# Altium footprint library NES-Footprints.PcbLib: 92 footprints (part 2 of 6)
Each footprint in its own frame and in the unit in brackets; x right, y up, seen from the top. Pads: shape width x height; smd on the part's side, far side on the other; paste and mask are expansions set on the pad; w line width, h text height; cw(c..) or ccw(c..) is an arc to the next point about the centre after c.
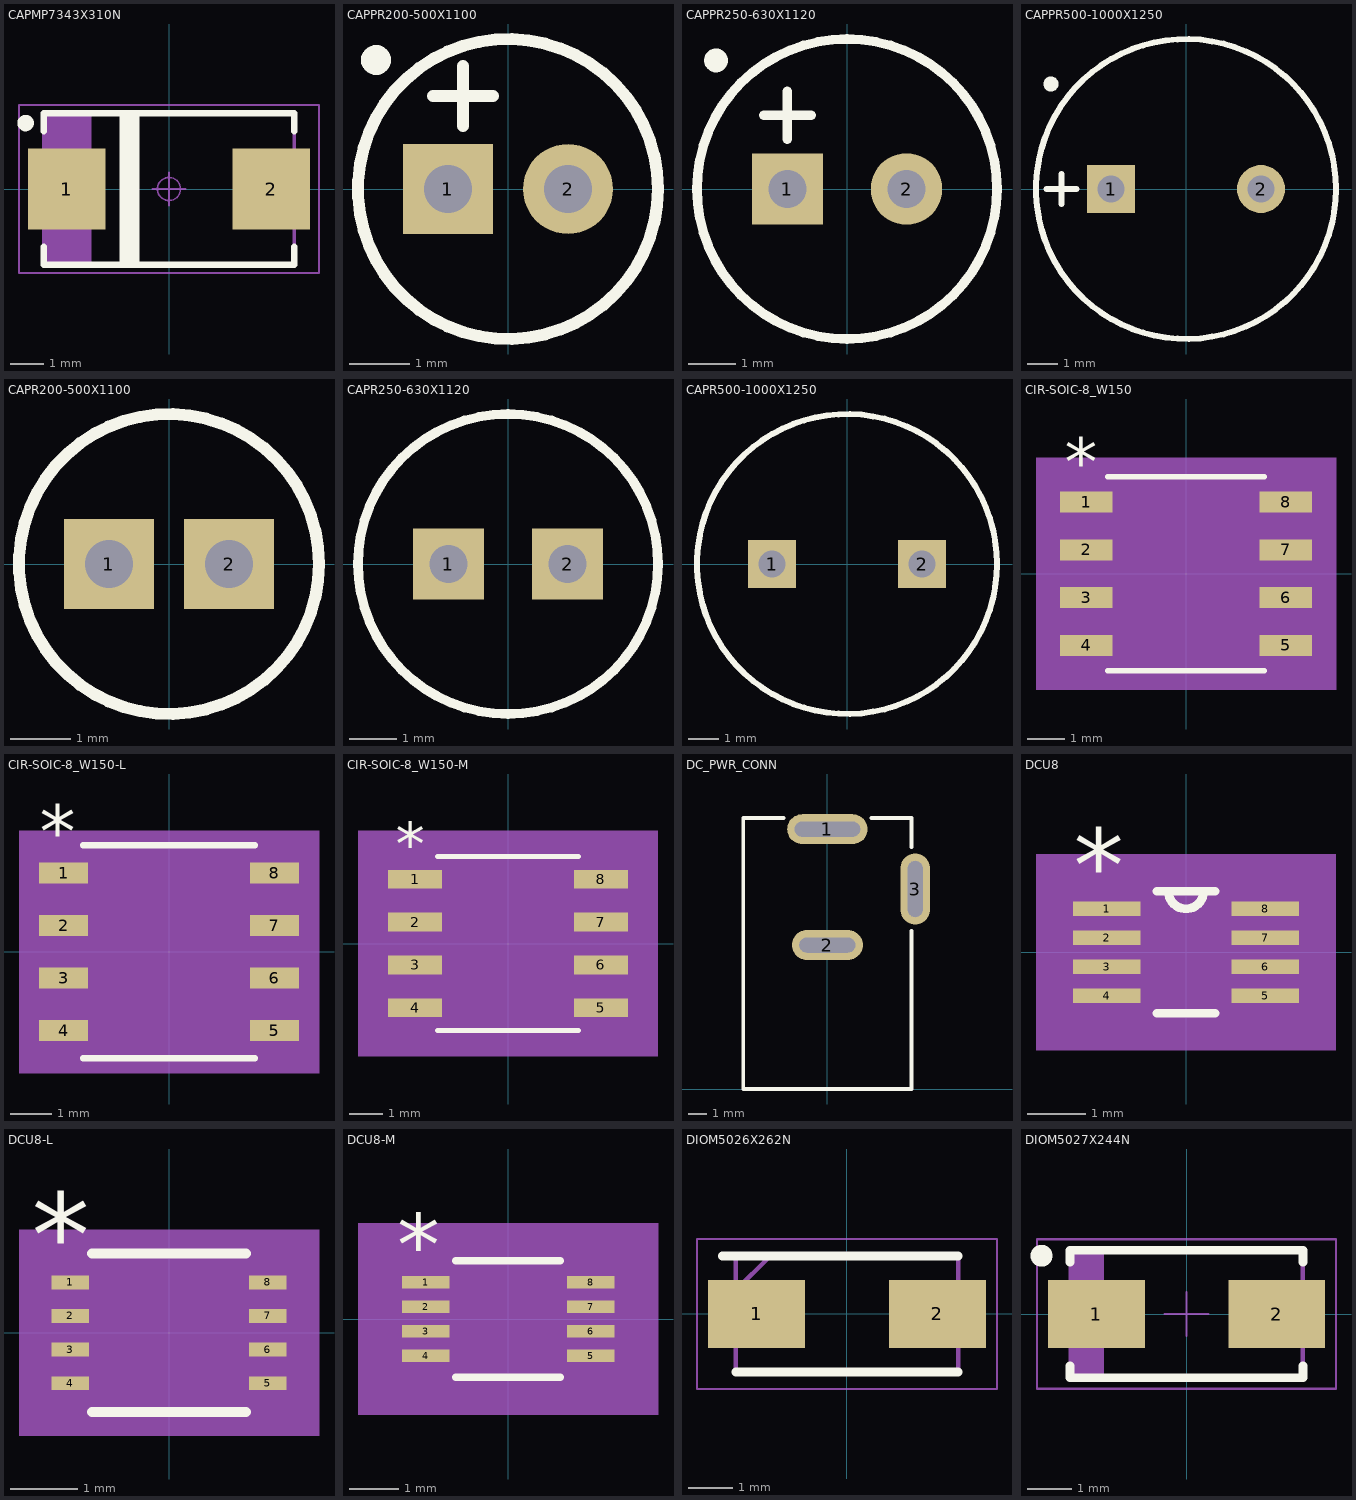
[diagram p1: the footprints below, top view; thin cyan lines are the x and y axes]

## CAPMP7343X310N [mm] "Capacitor, Polarized, Molded  Body 7.3x4.3mm, IPC Medium Density"
height 3.1
pads (2):
  rect 2.35x2.45 smd: 1(-3.1,0) 2(3.1,0)
Top Overlay:
  circle w0.25: c-4.35,2 r0.125
  rectangle: -1.5,-2.3 -0.9,2.3
  lines w0.2: -3.8,-1.75 -3.8,-2.3 3.8,-2.3 3.8,-1.75 ; -3.8,1.75 -3.8,2.3 3.8,2.3 3.8,1.75
Mechanical 14:
  lines w0.1: -3.75,-2.3 -3.75,2.3 ; -3.675,-2.3 -3.675,2.3 ; -3.6,-2.3 -3.6,2.3 ; -3.525,-2.3 -3.525,2.3 ; -3.45,-2.3 -3.45,2.3 ; -3.375,-2.3 -3.375,2.3 ; -3.3,-2.3 -3.3,2.3 ; -3.225,-2.3 -3.225,2.3 ; -3.15,-2.3 -3.15,2.3 ; -3.075,-2.3 -3.075,2.3 ; -3,-2.3 -3,2.3 ; -2.925,-2.3 -2.925,2.3 ; -2.85,-2.3 -2.85,2.3 ; -2.775,-2.3 -2.775,2.3 ; -2.7,-2.3 -2.7,2.3 ; -2.625,-2.3 -2.625,2.3 ; -2.55,-2.3 -2.55,2.3 ; -2.475,-2.3 -2.475,2.3 ; -2.4,-2.3 -2.4,2.3 ; -3.8,-2.3 3.8,-2.3 3.8,2.3 -3.8,2.3 -3.8,-2.3
Mechanical 15:
  circle w0.05: c0,0 r0.35
  lines w0.05: -0.5,0 0.5,0 ; 0,-0.5 0,0.5 ; -4.55,-2.55 4.55,-2.55 4.55,2.55 -4.55,2.55 -4.55,-2.55
3D body "CAPMP7343X310N.stp": height 3.1, standoff 0, extent -3.8,-2.3 3.8,2.3

## CAPPR200-500X1100 [mm] "Capacitor, Radial, Pin spacing 2.0mm - Body Diameter 5.0mm X Body Height 11mm"
height 11
pads (2):
  rect 1.5x1.5 hole 0.8: 1(-1,0)
  round 1.5 hole 0.8: 2(1,0)
Top Overlay:
  circle w0.25: c-2.2,2.15 r0.125
  circle w0.2: c0,0 r2.5
  lines w0.2: -1.25,1.55 -0.25,1.55 ; -0.75,1.05 -0.75,2.05
Mechanical 13:
  circle w0.1: c0,0 r2.5
Mechanical 14:
  circle w0.1: c0,0 r2.5
  lines w0.1: -1.25,1.55 -0.25,1.55 ; -0.75,1.05 -0.75,2.05
Top Assembly:
  circle w0.05: c0,0 r2.5
  text "+" at -1.5,-0.75 h1.5
  text "-" at 0.5,-0.75 h1.5
3D body "CAPPR200-500X1100.stp": height 10.9, standoff -3.6, extent -2.512,-2.512 2.488,2.488

## CAPPR250-630X1120 [mm] "Capacitor, Radial, Pin spacing 2.5mm - Body Diameter 6.3mm X Body Height 11.2mm"
height 11.2
pads (2):
  rect 1.5x1.5 hole 0.8: 1(-1.25,0)
  round 1.5 hole 0.8: 2(1.25,0)
Top Overlay:
  circle w0.25: c-2.75,2.7 r0.125
  circle w0.2: c0,0 r3.15
  lines w0.2: -1.75,1.55 -0.75,1.55 ; -1.25,1.05 -1.25,2.05
Mechanical 13:
  circle w0.1: c0,0 r3.15
Mechanical 14:
  circle w0.1: c0,0 r3.15
  lines w0.1: -1.75,1.55 -0.75,1.55 ; -1.25,1.05 -1.25,2.05
Top Assembly:
  circle w0.05: c0,0 r3.15
  text "+" at -1.75,-0.75 h1.5
  text "-" at 0.75,-0.75 h1.5
3D body "CAPPR250-630X1120.stp": height 11.2, standoff -3.6, extent -3.159,-3.159 3.141,3.107

## CAPPR500-1000X1250 [mm] "Capacitor, Radial, Pin spacing 5.0mm - Body Diameter 10.0mm X Body Height 12.5mm"
height 12.5
pads (2):
  rect 1.6x1.6 hole 0.9: 1(-2.5,0)
  round 1.6 hole 0.9: 2(2.5,0)
Top Overlay:
  circle w0.2: c0,0 r5
  circle w0.25: c-4.5,3.5 r0.125
  lines w0.2: -4.65,0 -3.65,0 ; -4.15,-0.5 -4.15,0.5
Mechanical 13:
  circle w0.1: c0,0 r5
Mechanical 14:
  circle w0.1: c0,0 r5
  lines w0.1: -4.65,0 -3.65,0 ; -4.15,-0.5 -4.15,0.5
Top Assembly:
  circle w0.05: c0,0 r5
  text "-" at 2,-0.75 h1.5
  text "+" at -3,-0.75 h1.5
3D body "CAPPR500-1000X1250.stp": height 12.5, standoff -3.6, extent -5.01,-5.01 4.99,4.956

## CAPR200-500X1100 [mm] "Capacitor, Radial, Pin spacing 2.0mm - Body Diameter 5.0mm X Body Height 11mm"
height 11
pads (2):
  rect 1.5x1.5 hole 0.8: 1(-1,0) 2(1,0)
Top Overlay:
  circle w0.2: c0,0 r2.5
Mechanical 13:
  circle w0.1: c0,0 r2.5
Mechanical 14:
  circle w0.1: c0,0 r2.5
3D body "CAPPR200-500X1100.stp": height 10.9, standoff -3.6, extent -2.512,-2.512 2.488,2.488

## CAPR250-630X1120 [mm] "Capacitor, Radial, Pin spacing 2.5mm - Body Diameter 6.3mm X Body Height 11.2mm"
height 11.2
pads (2):
  rect 1.5x1.5 hole 0.8: 1(-1.25,0) 2(1.25,0)
Top Overlay:
  circle w0.2: c0,0 r3.15
Mechanical 13:
  circle w0.1: c0,0 r3.15
Mechanical 14:
  circle w0.1: c0,0 r3.15
3D body "CAPPR250-630X1120.stp": height 11.2, standoff -3.6, extent -3.159,-3.159 3.141,3.107

## CAPR500-1000X1250 [mm] "Capacitor, Radial, Pin spacing 5.0mm - Body Diameter 10.0mm X Body Height 12.5mm"
height 12.5
pads (2):
  rect 1.6x1.6 hole 0.9: 1(-2.5,0) 2(2.5,0)
Top Overlay:
  circle w0.2: c0,0 r5
Mechanical 13:
  circle w0.1: c0,0 r5
Mechanical 14:
  circle w0.1: c0,0 r5
3D body "CAPPR500-1000X1250.stp": height 12.5, standoff -3.6, extent -5.01,-5.01 4.99,4.956

## CIR-SOIC-8_W150 [mil]
pads (8):
  rect 55x22 smd paste+0 mask+0: 1(-104.5,75) 2(-104.5,25) 3(-104.5,-25) 4(-104.5,-75) 5(104.5,-75) 6(104.5,-25) 7(104.5,25) 8(104.5,75)
Top Overlay:
  lines w6: -82,-101.5 82,-101.5 ; -82,101.5 82,101.5
  text "*" at -127,92 h50
Mechanical 5:
  region: 157,-121.5 -157,-121.5 -157,121.5 157,121.5
Mechanical 13:
  lines w0: -12,96.5 ccw(c0,96.5) 12,96.5
  lines w1: -118,-85 -77,-85 -77,-65 -118,-65 -118,-85 ; -118,-35 -77,-35 -77,-15 -118,-15 -118,-35 ; -118,15 -77,15 -77,35 -118,35 -118,15 ; -118,65 -77,65 -77,85 -118,85 -118,65 ; -77,-96.5 -77,96.5 77,96.5 77,-96.5 -77,-96.5 ; 77,-85 118,-85 118,-65 77,-65 77,-85 ; 77,-35 118,-35 118,-15 77,-15 77,-35 ; 77,15 118,15 118,35 77,35 77,15 ; 77,65 118,65 118,85 77,85 77,65
  text "*" at -74.5,43.5 h50
Mechanical 15:
  region: -87,-96 -142,-96 -142,96 -87,96 -87,106.5 87,106.5 87,96 142,96 142,-96 87,-96 87,-106.5 -87,-106.5
  lines w6: -142,-96 -87,-96 -87,-106.5 87,-106.5 87,-96 142,-96 142,96 87,96 87,106.5 -87,106.5 -87,96 -142,96 -142,-96
3D body "CIR-SOIC-8_W150.step": height 69.09, standoff 0, extent -117.99,-96.5 117.99,96.5

## CIR-SOIC-8_W150-L [mil]
pads (8):
  rect 47x20 smd paste+0 mask+0: 1(-100.5,75) 2(-100.5,25) 3(-100.5,-25) 4(-100.5,-75) 5(100.5,-75) 6(100.5,-25) 7(100.5,25) 8(100.5,75)
Top Overlay:
  lines w6: -82,-101.5 82,-101.5 ; -82,101.5 82,101.5
  text "*" at -123,90 h50
Mechanical 5:
  region: 143,-115.5 -143,-115.5 -143,115.5 143,115.5
Mechanical 13:
  lines w0: -12,96.5 ccw(c0,96.5) 12,96.5
  lines w1: -118,-85 -118,-65 -77,-65 -77,-85 -118,-85 ; -118,-35 -118,-15 -77,-15 -77,-35 -118,-35 ; -118,15 -118,35 -77,35 -77,15 -118,15 ; -118,65 -118,85 -77,85 -77,65 -118,65 ; -77,-96.5 77,-96.5 77,96.5 -77,96.5 -77,-96.5 ; 77,-85 77,-65 118,-65 118,-85 77,-85 ; 77,-35 77,-15 118,-15 118,-35 77,-35 ; 77,15 77,35 118,35 118,15 77,15 ; 77,65 77,85 118,85 118,65 77,65
  text "*" at -74.5,43.5 h50
Mechanical 15:
  region: -81,-89 -128,-89 -128,89 -81,89 -81,100.5 81,100.5 81,89 128,89 128,-89 81,-89 81,-100.5 -81,-100.5
  lines w6: -128,-89 -128,89 -81,89 -81,100.5 81,100.5 81,89 128,89 128,-89 81,-89 81,-100.5 -81,-100.5 -81,-89 -128,-89
3D body "CIR-SOIC-8_W150.step": height 69.09, standoff 0, extent -117.99,-96.5 117.99,96.5

## CIR-SOIC-8_W150-M [mil]
pads (8):
  rect 63x22 smd paste+0 mask+0: 1(-108.5,75) 2(-108.5,25) 3(-108.5,-25) 4(-108.5,-75) 5(108.5,-75) 6(108.5,-25) 7(108.5,25) 8(108.5,75)
Top Overlay:
  lines w6: -82,-101.5 82,-101.5 ; -82,101.5 82,101.5
  text "*" at -131,92 h50
Mechanical 5:
  region: 175,-131.5 -175,-131.5 -175,131.5 175,131.5
Mechanical 13:
  lines w0: -12,96.5 ccw(c0,96.5) 12,96.5
  lines w1: -118,-85 -77,-85 -77,-65 -118,-65 -118,-85 ; -118,-35 -77,-35 -77,-15 -118,-15 -118,-35 ; -118,15 -77,15 -77,35 -118,35 -118,15 ; -118,65 -77,65 -77,85 -118,85 -118,65 ; -77,-96.5 -77,96.5 77,96.5 77,-96.5 -77,-96.5 ; 77,-85 118,-85 118,-65 77,-65 77,-85 ; 77,-35 118,-35 118,-15 77,-15 77,-35 ; 77,15 118,15 118,35 77,35 77,15 ; 77,65 118,65 118,85 77,85 77,65
  text "*" at -74.5,43.5 h50
Mechanical 15:
  region: -97,-106 -160,-106 -160,106 -97,106 -97,116.5 97,116.5 97,106 160,106 160,-106 97,-106 97,-116.5 -97,-116.5
  lines w6: -160,-106 -97,-106 -97,-116.5 97,-116.5 97,-106 160,-106 160,106 97,106 97,116.5 -97,116.5 -97,106 -160,106 -160,-106
3D body "CIR-SOIC-8_W150.step": height 69.09, standoff 0, extent -117.99,-96.5 117.99,96.5

## DC_PWR_CONN [mm]
pads (3):
  oval 4.3x1.6 hole 0.8 slot 3.5 at 0 deg: 1(0,13.9)
  oval 3.8x1.6 hole 0.8 slot 3 at 0 deg: 2(0,7.7)
  oval 1.6x3.8 hole 0.8 slot 3 at 90 deg: 3(4.7,10.7)
Top Overlay:
  lines w0.2: -2.35,14.5 -4.5,14.5 -4.5,0 4.5,0 4.5,8.45 ; 2.35,14.5 4.5,14.5 4.5,12.95
3D body "CLIFF_FC68148(DC-10A).stp": height 11, standoff -3.5, extent -4.5,0 5.2,14.2

## DCU8 [mil]
pads (8):
  rect 46x10 smd: 1(-54,29.53) 2(-54,9.84) 3(-54,-9.84) 4(-54,-29.53) 5(54,-29.53) 6(54,-9.84) 7(54,9.84) 8(54,29.53)
Top Overlay:
  lines w6: -19.91,-41.5 19.91,-41.5 ; -19.91,41.5 19.91,41.5 ; -12,41.5 ccw(c0,41.5) 12,41.5
  text "*" at -76.5,34.53 h50
Mechanical 5:
  region: 102,-66.5 -102,-66.5 -102,66.5 102,66.5
Mechanical 13:
  lines w0: -12,41.5 ccw(c0,41.5) 12,41.5
  lines w1: -63,-34.53 -47,-34.53 -47,-24.53 -63,-24.53 -63,-34.53 ; -63,-14.84 -47,-14.84 -47,-4.84 -63,-4.84 -63,-14.84 ; -63,4.84 -47,4.84 -47,14.84 -63,14.84 -63,4.84 ; -63,24.53 -47,24.53 -47,34.53 -63,34.53 -63,24.53 ; -47,-41.5 -47,41.5 47,41.5 47,-41.5 -47,-41.5 ; 47,-34.53 63,-34.53 63,-24.53 47,-24.53 47,-34.53 ; 47,-14.84 63,-14.84 63,-4.84 47,-4.84 47,-14.84 ; 47,4.84 63,4.84 63,14.84 47,14.84 47,4.84 ; 47,24.53 63,24.53 63,34.53 47,34.53 47,24.53
  text "*" at -76.5,34.53 h50
Mechanical 15:
  region: 87,-51.5 -87,-51.5 -87,51.5 87,51.5
  lines w6: -87,-51.5 87,-51.5 87,51.5 -87,51.5 -87,-51.5
3D body "DCU8.step": height 35.12, standoff 0, extent -62.99,-41.5 62.99,41.5

## DCU8-L [mil]
pads (8):
  rect 22x8 smd paste+0 mask+0: 1(-58,29.53) 2(-58,9.84) 3(-58,-9.84) 4(-58,-29.53) 5(58,-29.53) 6(58,-9.84) 7(58,9.84) 8(58,29.53)
Top Overlay:
  lines w6: -45.18,-46.5 45.18,-46.5 ; -45.18,46.5 45.18,46.5
  text "*" at -80.5,32.53 h50
Mechanical 5:
  region: 88,-60.5 -88,-60.5 -88,60.5 88,60.5
Mechanical 13:
  lines w0: -12,41.5 ccw(c0,41.5) 12,41.5
  lines w1: -63,-34.53 -47,-34.53 -47,-24.53 -63,-24.53 -63,-34.53 ; -63,-14.84 -47,-14.84 -47,-4.84 -63,-4.84 -63,-14.84 ; -63,4.84 -47,4.84 -47,14.84 -63,14.84 -63,4.84 ; -63,24.53 -47,24.53 -47,34.53 -63,34.53 -63,24.53 ; -47,-41.5 -47,41.5 47,41.5 47,-41.5 -47,-41.5 ; 47,-34.53 63,-34.53 63,-24.53 47,-24.53 47,-34.53 ; 47,-14.84 63,-14.84 63,-4.84 47,-4.84 47,-14.84 ; 47,4.84 63,4.84 63,14.84 47,14.84 47,4.84 ; 47,24.53 63,24.53 63,34.53 47,34.53 47,24.53
  text "*" at -44.5,-11.5 h50
Mechanical 15:
  region: -51,-37.53 -73,-37.53 -73,37.53 -51,37.53 -51,45.5 51,45.5 51,37.53 73,37.53 73,-37.53 51,-37.53 51,-45.5 -51,-45.5
  lines w6: -73,-37.53 -51,-37.53 -51,-45.5 51,-45.5 51,-37.53 73,-37.53 73,37.53 51,37.53 51,45.5 -51,45.5 -51,37.53 -73,37.53 -73,-37.53
3D body "DCU8.step": height 35.12, standoff 0, extent -62.99,-41.5 62.99,41.5

## DCU8-M [mil]
pads (8):
  rect 38x10 smd paste+0 mask+0: 1(-66,29.53) 2(-66,9.84) 3(-66,-9.84) 4(-66,-29.53) 5(66,-29.53) 6(66,-9.84) 7(66,9.84) 8(66,29.53)
Top Overlay:
  lines w6: -41.68,-46.5 41.68,-46.5 ; -41.68,46.5 41.68,46.5
  text "*" at -88.5,34.53 h50
Mechanical 5:
  region: 120,-76.5 -120,-76.5 -120,76.5 120,76.5
Mechanical 13:
  lines w0: -12,41.5 ccw(c0,41.5) 12,41.5
  lines w1: -63,-34.53 -47,-34.53 -47,-24.53 -63,-24.53 -63,-34.53 ; -63,-14.84 -47,-14.84 -47,-4.84 -63,-4.84 -63,-14.84 ; -63,4.84 -47,4.84 -47,14.84 -63,14.84 -63,4.84 ; -63,24.53 -47,24.53 -47,34.53 -63,34.53 -63,24.53 ; -47,-41.5 -47,41.5 47,41.5 47,-41.5 -47,-41.5 ; 47,-34.53 63,-34.53 63,-24.53 47,-24.53 47,-34.53 ; 47,-14.84 63,-14.84 63,-4.84 47,-4.84 47,-14.84 ; 47,4.84 63,4.84 63,14.84 47,14.84 47,4.84 ; 47,24.53 63,24.53 63,34.53 47,34.53 47,24.53
  text "*" at -44.5,-11.5 h50
Mechanical 15:
  region: -67,-54.53 -105,-54.53 -105,54.53 -67,54.53 -67,61.5 67,61.5 67,54.53 105,54.53 105,-54.53 67,-54.53 67,-61.5 -67,-61.5
  lines w6: -105,-54.53 -67,-54.53 -67,-61.5 67,-61.5 67,-54.53 105,-54.53 105,54.53 67,54.53 67,61.5 -67,61.5 -67,54.53 -105,54.53 -105,-54.53
3D body "DCU8.step": height 35.12, standoff 0, extent -62.99,-41.5 62.99,41.5

## DIOM5026X262N [mm]
pads (2):
  rect 2.2x1.55 smd: 1(-2.05,0) 2(2.05,0)
Top Overlay:
  lines w0.2: -2.825,1.312 2.52,1.312 ; -2.52,-1.312 2.52,-1.312
Mechanical 13:
  lines w0.1: -2.52,0.538 -1.745,1.312 ; -2.52,-1.312 2.52,-1.312 2.52,1.312 -2.52,1.312 -2.52,-1.312
Mechanical 15:
  lines w0.05: -3.4,-1.7 3.4,-1.7 3.4,1.7 -3.4,1.7 -3.4,-1.7
3D body "SS22A.stp": height 2.62, standoff 0, extent -2.52,-1.312 2.52,1.312

## DIOM5027X244N [mm] "DO-214-AC/SMA  Molded Diode, Body 5.0x2.7mm, IPC Medium Density"
height 2.44
pads (2):
  rect 2.2x1.55 smd: 1(-2.05,0) 2(2.05,0)
Top Overlay:
  circle w0.25: c-3.3,1.325 r0.125
  lines w0.2: -2.65,-1.175 -2.65,-1.45 2.65,-1.45 2.65,-1.175 ; -2.65,1.175 -2.65,1.45 2.65,1.45 2.65,1.175
Mechanical 14:
  lines w0.1: -2.575,-1.45 -2.575,1.45 ; -2.525,-1.45 -2.525,1.45 ; -2.45,-1.45 -2.45,1.45 ; -2.375,-1.45 -2.375,1.45 ; -2.3,-1.45 -2.3,1.45 ; -2.225,-1.45 -2.225,1.45 ; -2.15,-1.45 -2.15,1.45 ; -2.075,-1.45 -2.075,1.45 ; -2,-1.45 -2,1.45 ; -1.925,-1.45 -1.925,1.45 ; -2.64,-1.45 2.64,-1.45 2.64,1.45 -2.64,1.45 -2.64,-1.45
Mechanical 15:
  lines w0.05: -0.5,0 0.5,0 ; 0,-0.5 0,0.5 ; -3.4,-1.7 3.4,-1.7 3.4,1.7 -3.4,1.7 -3.4,-1.7
3D body "DIOM5027X244N.stp": height 2.44, standoff 0, extent -2.6,-1.45 2.6,1.45